# Altium footprint library RoBeast_PCB_Library.PcbLib: 71 footprints (part 5 of 5)
Each footprint in its own frame and in the unit in brackets; x right, y up, seen from the top. Pads: shape width x height; smd on the part's side, far side on the other; paste and mask are expansions set on the pad; w line width, h text height; cw(c..) or ccw(c..) is an arc to the next point about the centre after c.
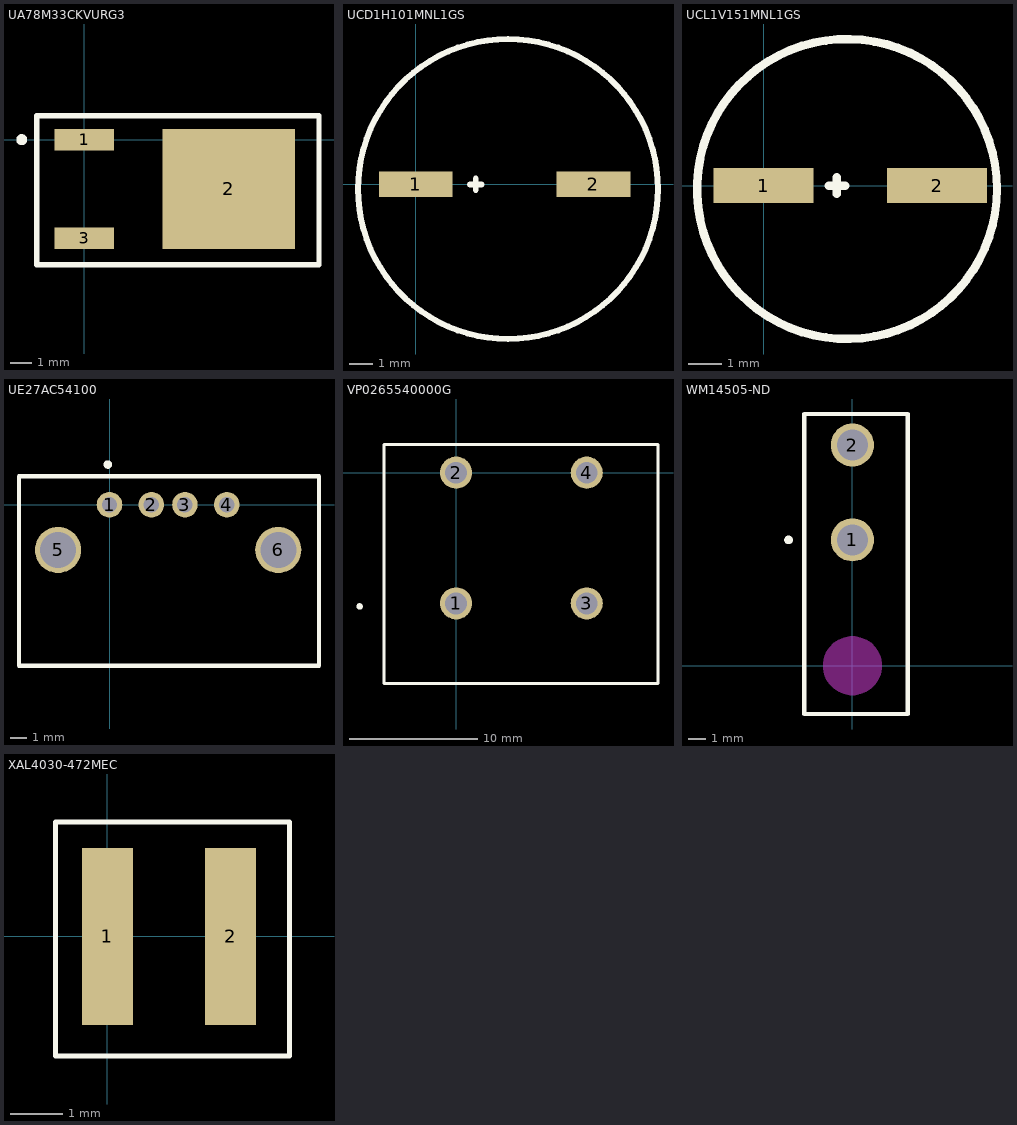
[diagram p4: the footprints below, top view; thin cyan lines are the x and y axes]

## UA78M33CKVURG3 [mm]
pads (3):
  rect 2.75x1 smd: 1(0,0) 3(0,-4.58)
  rect 6.15x5.55 smd: 2(6.7,-2.29)
Top Overlay:
  circle w0.254: c-2.9,0 r0.127
  lines w0.254: -2.212,-5.8 10.9,-5.8 10.9,1.11 -2.212,1.11 -2.212,-5.8
3D body "KVU0003A.stp": height 2.41, standoff -0.02, extent -1.078,-5.563 9.028,0.962

## UCD1H101MNL1GS [mm]
pads (2):
  rect 3.2x1.1 smd: 1(0,0) 2(7.7,0)
Top Overlay:
  circle w0.254: c4,-0.2 r6.5
  lines w0.254: 2.35,0 2.85,0 ; 2.6,-0.25 2.6,0.25
3D body "PCAP_8x10-ELECT_NCA.step": height 10.34, standoff 0, extent -0.748,-4.254 8.548,4.254

## UCL1V151MNL1GS [mm]
pads (2):
  rect 3x1.05 smd: 1(0,0) 2(5.2,0)
Top Overlay:
  circle w0.254: c2.5,-0.1 r4.494
  lines w0.254: 1.95,0 2.45,0 ; 2.2,-0.25 2.2,0.25
3D body "UCL1V151MNL1GS.step": height 11, standoff 0.2, extent -1.85,-4.15 7.05,4.15

## UE27AC54100 [mm]
pads (6):
  round 1.524 hole 0.92: 1(0,0) 2(2.5,0) 3(4.5,0) 4(7,0)
  round 2.75 hole 2.15: 5(-3.07,-2.7) 6(10.07,-2.7)
Top Overlay:
  circle w0.254: c-0.1,2.4 r0.127
  lines w0.254: -5.4,-9.6 -5.4,1.7 -5.2,1.7 12.5,1.7 12.5,-9.6 -5.4,-9.6
3D body "USB-A1HSW6--3DModel-STEP-56544.STEP": height 7.56, standoff -3.24, extent -4.5,-13.15 11.3,0.95

## VP0265540000G [mm]
pads (4):
  round 2.5 hole 1.7: 1(0,-10.16) 2(0,0) 3(10.16,-10.16) 4(10.16,0)
Top Overlay:
  circle w0.254: c-7.5,-10.4 r0.127
  lines w0.254: -5.6,-16.4 -5.6,2.2 15.7,2.2 15.7,-16.4 -5.6,-16.4
3D body "VP0265540000G.STEP": height 28.5, standoff -4.6, extent -5.46,-16.45 15.46,1.85

## WM14505-ND [mm]
pads (2):
  round 2.5 hole 1.8: 1(0,7.3) 2(0,12.8)
Top Overlay:
  circle w0.254: c-3.7,7.3 r0.127
  lines w0.254: -2.8,-2.8 -2.8,14.6 3.2,14.6 3.2,-2.8 -2.8,-2.8
Keep-Out Layer:
  board cut-out: 0,-1.7 -0.167,-1.7 -0.496,-1.635 -0.805,-1.507 -1.084,-1.32 -1.32,-1.084 -1.507,-0.805 -1.635,-0.496 -1.7,-0.167 -1.7,0 -1.7,0.167 -1.635,0.496 -1.507,0.805 -1.32,1.084 -1.084,1.32 -0.805,1.507 -0.496,1.635 -0.167,1.7 0,1.7 0.167,1.7 0.496,1.635 0.805,1.507 1.084,1.32 1.32,1.084 1.507,0.805 1.635,0.496 1.7,0.167 1.7,0 1.7,-0.167 1.635,-0.496 1.507,-0.805 1.32,-1.084 1.084,-1.32 0.805,-1.507 0.496,-1.635 0.167,-1.7
3D body "026013114.stp": height 11.4, standoff -3.6, extent -2.7,-6.6 3.1,13.335

## XAL4030-472MEC [mm]
pads (2):
  rect 0.98x3.4 smd: 1(0,0) 2(2.37,0)
Top Overlay:
  lines w0.1: -1,-2.3 3.5,-2.3 3.5,2.2 -1,2.2 -1,-2.3
3D body "XAL4030-472MEC_COC.step": height 0.81, standoff 0, extent -0.807,-2.007 3.207,2.007